# Altium schematic symbol library JL_SCH.SchLib: 1185 symbols (part 5 of 6) (continued)
## STC15F1K60XW-LQFP44 (continued)

## STC15F1K60XW-PDIP40
designator U?
footprint PDIP-40
pins: 1 P0.0/AD0, 2 P0.1/AD1, 3 P0.2/AD2, 4 P0.3/AD3, 5 P0.4/AD4, 6 P0.5/AD5, 7 P0.6/AD6, 8 P0.7/AD7, 9 P1.0, 10 P1.1, 11 P1.2/CMP+, 12 P1.3, 13 P1.4/CMP-, 14 P1.5, 15 P1.6/RxD_3/XTAL2, 16 P1.7/TxD_3/XTAL1, 17 P5.4/RST/MCLKO, 18 VCC (power), 19 P5.5/CAP, 20 GND (power), 21 T2CLKO/~{INT4}/RxD/P3.0, 22 T2/TxD/P3.1, 23 INT0/P3.2, 24 INT1/P3.3, 25 T1CLKO/T0/P3.4, 26 T0CLKO/T1/P3.5, 27 RxD_2/~{INT2}/P3.6, 28 TxD_2/~{INT3}/P3.7, 29 P4.1, 30 ~{WR}/P4.2, 31 ~{RD}/P4.4, 32 RSTOUT_LOW/A8/P2.0, 33 A9/P2.1, 34 A10/P2.2, 35 A11/P2.3, 36 A12/P2.4, 37 A13/P2.5, 38 A14/P2.6, 39 A15/P2.7, 40 ALE/P4.5

## STC15F1K60XW-PLCC44
designator U?
footprint PLCC-44
pins: 1 P4.6, 2 AD0/P0.0, 3 AD1/P0.1, 4 AD2/P0.2, 5 AD3/P0.3, 6 AD4/P0.4, 7 P0.5/AD5, 8 P0.6/AD6, 9 P0.7/AD7, 10 P1.0, 11 P1.1, 12 P4.7, 13 P1.2/CMP+, 14 P1.3, 15 P1.4/CMP-, 16 P1.5, 17 P1.6/RxD_3/XTAL2, 18 P1.7/TxD_3/XTAL1, 19 P5.4/RST/MCLKO, 20 VCC (power), 21 P5.5/CAP, 22 GND (power), 23 P4.0, 24 P3.0/RxD/~{INT4}/T2CLKO, 25 P3.1/TxD/T2, 26 P3.2/INT0, 27 P3.3/INT1, 28 P3.4/T0/T1CLKO, 29 T0CLKO/T1/P3.5, 30 RxD_2/~{INT2}/P3.6, 31 TxD_2/~{INT3}/P3.7, 32 P4.1, 33 ~{WR}/P4.2, 34 P4.3, 35 ~{RD}/P4.4, 36 RSTOUT_LOW/A8/P2.0, 37 A9/P2.1, 38 A10/P2.2, 39 A11/P2.3, 40 A12/P2.4, 41 A13/P2.5, 42 A14/P2.6, 43 A15/P2.7, 44 ALE/P4.5

## STC15F1K60XW-SOP28/SKDIP28
designator U?
footprint SOP-28
footprint SKDIP-28
pins: 1 P2.6, 2 P2.7, 3 P1.0, 4 P1.1, 5 P1.2/CMP+, 6 P1.3, 7 P1.4/CMP-, 8 P1.5, 9 P1.6/RxD_3/XTAL2, 10 P1.7/TxD_3/XTAL1, 11 P5.4/RST/MCLKO, 12 VCC (power), 13 P5.5/CAP, 14 GND (power), 15 T2CLKO/~{INT4}/RxD/P3.0, 16 T2/TxD/P3.1, 17 INT0/P3.2, 18 INT1/P3.3, 19 T1CLKO/T0/P3.4, 20 T0CLKO/T1/P3.5, 21 RxD_2/~{INT2}/P3.6, 22 TxD_2/~{INT3}/P3.7, 23 RSTOUT_LOW/P2.0, 24 P2.1, 25 P2.2, 26 P2.3, 27 P2.4, 28 P2.5

## STC15F1K60XW-SOP32
designator U?
footprint SOP-32
pins: 1 P0.0, 2 P0.1, 3 P0.2, 4 P0.3, 5 P1.0, 6 P1.1, 7 P1.2/CMP+, 8 P1.3, 9 P1.4/CMP-, 10 P1.5, 11 P1.6/RxD_3/XTAL2, 12 P1.7/TxD_3/XTAL1, 13 P5.4/RST/MCLKO, 14 VCC (power), 15 P5.5/CAP, 16 GND (power), 17 T2CLKO/~{INT4}/RxD/P3.0, 18 T2/TxD/P3.1, 19 INT0/P3.2, 20 INT1/P3.3, 21 T1CLKO/T0/P3.4, 22 T0CLKO/T1/P3.5, 23 RxD_2/~{INT2}/P3.6, 24 TxD_2/~{INT3}/P3.7, 25 RSTOUT_LOW/P2.0, 26 P2.1, 27 P2.2, 28 P2.3, 29 P2.4, 30 P2.5, 31 P2.6, 32 P2.7

## STC15F2K60S2-LQFP32
designator U?
footprint LQFP-32
pins: 1 P1.0/ADC0/CCP1/RxD2, 2 P1.1/ADC1/CCP0/TxD2, 3 P1.2/ADC2/SS/ECI, 4 P1.3/ADC3/MOSI, 5 P1.4/ADC4/MISO, 6 P1.5/ADC5/SCLK, 7 P1.6/ADC6/RxD_3/XTAL2, 8 P1.7/ADC7/TxD_3/XTAL1, 9 MCLKO/RST/P5.4, 10 VCC (power), 11 P5.5, 12 GND (power), 13 T2CLKO/~{INT4}/RxD/P3.0, 14 T2/TxD/P3.1, 15 INT0/P3.2, 16 INT1/P3.3, 17 ECI_2/T1CLKO/T0/P3.4, 18 CCP0_2/T0CLKO/T1/P3.5, 19 CCP1_2/RxD_2/~{INT2}/P3.6, 20 CCP2_2/CCP2/TxD_2/~{INT3}/P3.7, 21 RSTOUT_LOW/P2.0, 22 SCLK_2/P2.1, 23 MISO_2/P2.2, 24 MOSI_2/P2.3, 25 P2.4/ECI_3/SS_2, 26 P2.5/CCP0_3, 27 P2.6/CCP1_3, 28 P2.7/CCP2_3, 29 P0.0, 30 P0.1, 31 P0.2, 32 P0.3

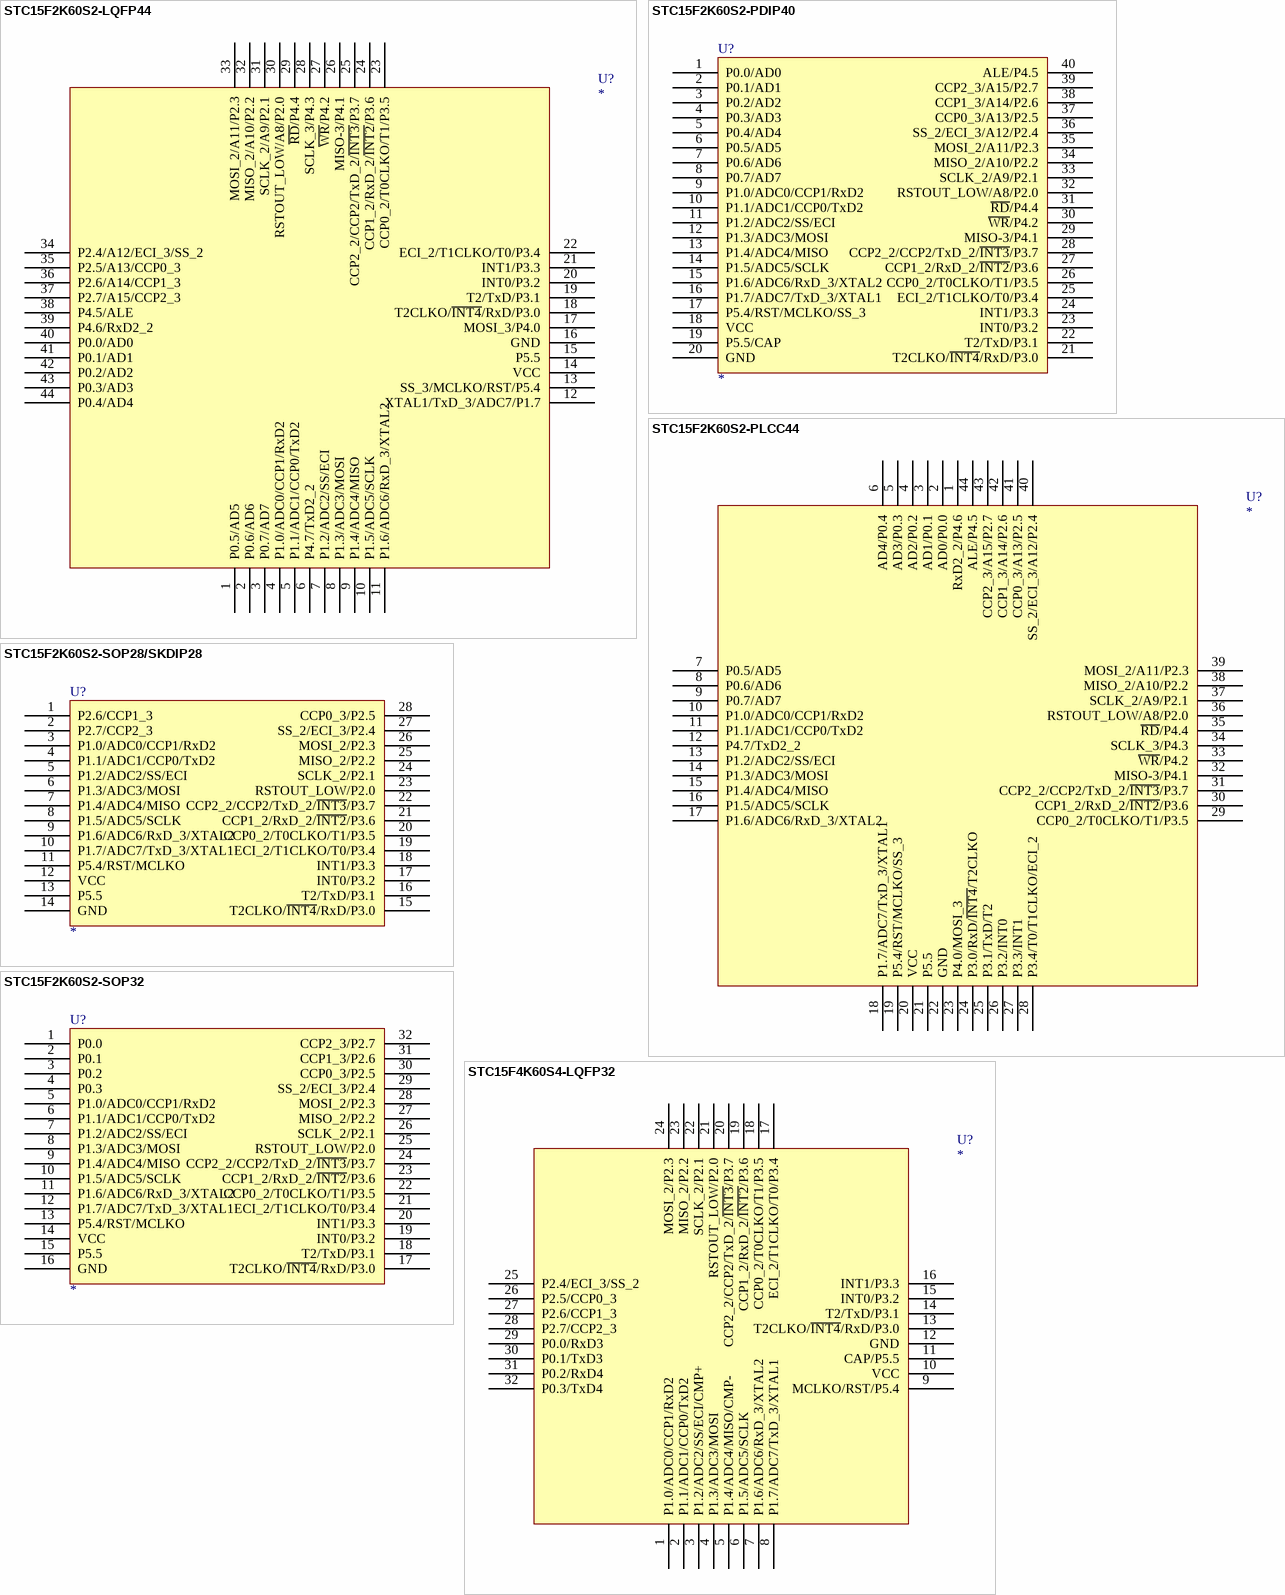
[diagram p31: symbols STC15F2K60S2-LQFP44 to STC15F4K60S4-LQFP32]

## STC15F2K60S2-LQFP44
designator U?
footprint LQFP-44
pins: 1 P0.5/AD5, 2 P0.6/AD6, 3 P0.7/AD7, 4 P1.0/ADC0/CCP1/RxD2, 5 P1.1/ADC1/CCP0/TxD2, 6 P4.7/TxD2_2, 7 P1.2/ADC2/SS/ECI, 8 P1.3/ADC3/MOSI, 9 P1.4/ADC4/MISO, 10 P1.5/ADC5/SCLK, 11 P1.6/ADC6/RxD_3/XTAL2, 12 XTAL1/TxD_3/ADC7/P1.7, 13 SS_3/MCLKO/RST/P5.4, 14 VCC (power), 15 P5.5, 16 GND (power), 17 MOSI_3/P4.0, 18 T2CLKO/~{INT4}/RxD/P3.0, 19 T2/TxD/P3.1, 20 INT0/P3.2, 21 INT1/P3.3, 22 ECI_2/T1CLKO/T0/P3.4, 23 CCP0_2/T0CLKO/T1/P3.5, 24 CCP1_2/RxD_2/~{INT2}/P3.6, 25 CCP2_2/CCP2/TxD_2/~{INT3}/P3.7, 26 MISO-3/P4.1, 27 ~{WR}/P4.2, 28 SCLK_3/P4.3, 29 ~{RD}/P4.4, 30 RSTOUT_LOW/A8/P2.0, 31 SCLK_2/A9/P2.1, 32 MISO_2/A10/P2.2, 33 MOSI_2/A11/P2.3, 34 P2.4/A12/ECI_3/SS_2, 35 P2.5/A13/CCP0_3, 36 P2.6/A14/CCP1_3, 37 P2.7/A15/CCP2_3, 38 P4.5/ALE, 39 P4.6/RxD2_2, 40 P0.0/AD0, 41 P0.1/AD1, 42 P0.2/AD2, 43 P0.3/AD3, 44 P0.4/AD4

## STC15F2K60S2-PDIP40
designator U?
footprint PDIP-40
pins: 1 P0.0/AD0, 2 P0.1/AD1, 3 P0.2/AD2, 4 P0.3/AD3, 5 P0.4/AD4, 6 P0.5/AD5, 7 P0.6/AD6, 8 P0.7/AD7, 9 P1.0/ADC0/CCP1/RxD2, 10 P1.1/ADC1/CCP0/TxD2, 11 P1.2/ADC2/SS/ECI, 12 P1.3/ADC3/MOSI, 13 P1.4/ADC4/MISO, 14 P1.5/ADC5/SCLK, 15 P1.6/ADC6/RxD_3/XTAL2, 16 P1.7/ADC7/TxD_3/XTAL1, 17 P5.4/RST/MCLKO/SS_3, 18 VCC (power), 19 P5.5/CAP, 20 GND (power), 21 T2CLKO/~{INT4}/RxD/P3.0, 22 T2/TxD/P3.1, 23 INT0/P3.2, 24 INT1/P3.3, 25 ECI_2/T1CLKO/T0/P3.4, 26 CCP0_2/T0CLKO/T1/P3.5, 27 CCP1_2/RxD_2/~{INT2}/P3.6, 28 CCP2_2/CCP2/TxD_2/~{INT3}/P3.7, 29 MISO-3/P4.1, 30 ~{WR}/P4.2, 31 ~{RD}/P4.4, 32 RSTOUT_LOW/A8/P2.0, 33 SCLK_2/A9/P2.1, 34 MISO_2/A10/P2.2, 35 MOSI_2/A11/P2.3, 36 SS_2/ECI_3/A12/P2.4, 37 CCP0_3/A13/P2.5, 38 CCP1_3/A14/P2.6, 39 CCP2_3/A15/P2.7, 40 ALE/P4.5

## STC15F2K60S2-PLCC44
designator U?
footprint PLCC-44
pins: 1 RxD2_2/P4.6, 2 AD0/P0.0, 3 AD1/P0.1, 4 AD2/P0.2, 5 AD3/P0.3, 6 AD4/P0.4, 7 P0.5/AD5, 8 P0.6/AD6, 9 P0.7/AD7, 10 P1.0/ADC0/CCP1/RxD2, 11 P1.1/ADC1/CCP0/TxD2, 12 P4.7/TxD2_2, 13 P1.2/ADC2/SS/ECI, 14 P1.3/ADC3/MOSI, 15 P1.4/ADC4/MISO, 16 P1.5/ADC5/SCLK, 17 P1.6/ADC6/RxD_3/XTAL2, 18 P1.7/ADC7/TxD_3/XTAL1, 19 P5.4/RST/MCLKO/SS_3, 20 VCC (power), 21 P5.5, 22 GND (power), 23 P4.0/MOSI_3, 24 P3.0/RxD/~{INT4}/T2CLKO, 25 P3.1/TxD/T2, 26 P3.2/INT0, 27 P3.3/INT1, 28 P3.4/T0/T1CLKO/ECI_2, 29 CCP0_2/T0CLKO/T1/P3.5, 30 CCP1_2/RxD_2/~{INT2}/P3.6, 31 CCP2_2/CCP2/TxD_2/~{INT3}/P3.7, 32 MISO-3/P4.1, 33 ~{WR}/P4.2, 34 SCLK_3/P4.3, 35 ~{RD}/P4.4, 36 RSTOUT_LOW/A8/P2.0, 37 SCLK_2/A9/P2.1, 38 MISO_2/A10/P2.2, 39 MOSI_2/A11/P2.3, 40 SS_2/ECI_3/A12/P2.4, 41 CCP0_3/A13/P2.5, 42 CCP1_3/A14/P2.6, 43 CCP2_3/A15/P2.7, 44 ALE/P4.5

## STC15F2K60S2-SOP28/SKDIP28
designator U?
footprint SOP-28
footprint SKDIP-28
pins: 1 P2.6/CCP1_3, 2 P2.7/CCP2_3, 3 P1.0/ADC0/CCP1/RxD2, 4 P1.1/ADC1/CCP0/TxD2, 5 P1.2/ADC2/SS/ECI, 6 P1.3/ADC3/MOSI, 7 P1.4/ADC4/MISO, 8 P1.5/ADC5/SCLK, 9 P1.6/ADC6/RxD_3/XTAL2, 10 P1.7/ADC7/TxD_3/XTAL1, 11 P5.4/RST/MCLKO, 12 VCC (power), 13 P5.5, 14 GND (power), 15 T2CLKO/~{INT4}/RxD/P3.0, 16 T2/TxD/P3.1, 17 INT0/P3.2, 18 INT1/P3.3, 19 ECI_2/T1CLKO/T0/P3.4, 20 CCP0_2/T0CLKO/T1/P3.5, 21 CCP1_2/RxD_2/~{INT2}/P3.6, 22 CCP2_2/CCP2/TxD_2/~{INT3}/P3.7, 23 RSTOUT_LOW/P2.0, 24 SCLK_2/P2.1, 25 MISO_2/P2.2, 26 MOSI_2/P2.3, 27 SS_2/ECI_3/P2.4, 28 CCP0_3/P2.5

## STC15F2K60S2-SOP32
designator U?
footprint SOP-32
pins: 1 P0.0, 2 P0.1, 3 P0.2, 4 P0.3, 5 P1.0/ADC0/CCP1/RxD2, 6 P1.1/ADC1/CCP0/TxD2, 7 P1.2/ADC2/SS/ECI, 8 P1.3/ADC3/MOSI, 9 P1.4/ADC4/MISO, 10 P1.5/ADC5/SCLK, 11 P1.6/ADC6/RxD_3/XTAL2, 12 P1.7/ADC7/TxD_3/XTAL1, 13 P5.4/RST/MCLKO, 14 VCC (power), 15 P5.5, 16 GND (power), 17 T2CLKO/~{INT4}/RxD/P3.0, 18 T2/TxD/P3.1, 19 INT0/P3.2, 20 INT1/P3.3, 21 ECI_2/T1CLKO/T0/P3.4, 22 CCP0_2/T0CLKO/T1/P3.5, 23 CCP1_2/RxD_2/~{INT2}/P3.6, 24 CCP2_2/CCP2/TxD_2/~{INT3}/P3.7, 25 RSTOUT_LOW/P2.0, 26 SCLK_2/P2.1, 27 MISO_2/P2.2, 28 MOSI_2/P2.3, 29 SS_2/ECI_3/P2.4, 30 CCP0_3/P2.5, 31 CCP1_3/P2.6, 32 CCP2_3/P2.7

## STC15F4K60S4-LQFP32
designator U?
footprint LQFP-32
pins: 1 P1.0/ADC0/CCP1/RxD2, 2 P1.1/ADC1/CCP0/TxD2, 3 P1.2/ADC2/SS/ECI/CMP+, 4 P1.3/ADC3/MOSI, 5 P1.4/ADC4/MISO/CMP-, 6 P1.5/ADC5/SCLK, 7 P1.6/ADC6/RxD_3/XTAL2, 8 P1.7/ADC7/TxD_3/XTAL1, 9 MCLKO/RST/P5.4, 10 VCC (power), 11 CAP/P5.5, 12 GND (power), 13 T2CLKO/~{INT4}/RxD/P3.0, 14 T2/TxD/P3.1, 15 INT0/P3.2, 16 INT1/P3.3, 17 ECI_2/T1CLKO/T0/P3.4, 18 CCP0_2/T0CLKO/T1/P3.5, 19 CCP1_2/RxD_2/~{INT2}/P3.6, 20 CCP2_2/CCP2/TxD_2/~{INT3}/P3.7, 21 RSTOUT_LOW/P2.0, 22 SCLK_2/P2.1, 23 MISO_2/P2.2, 24 MOSI_2/P2.3, 25 P2.4/ECI_3/SS_2, 26 P2.5/CCP0_3, 27 P2.6/CCP1_3, 28 P2.7/CCP2_3, 29 P0.0/RxD3, 30 P0.1/TxD3, 31 P0.2/RxD4, 32 P0.3/TxD4

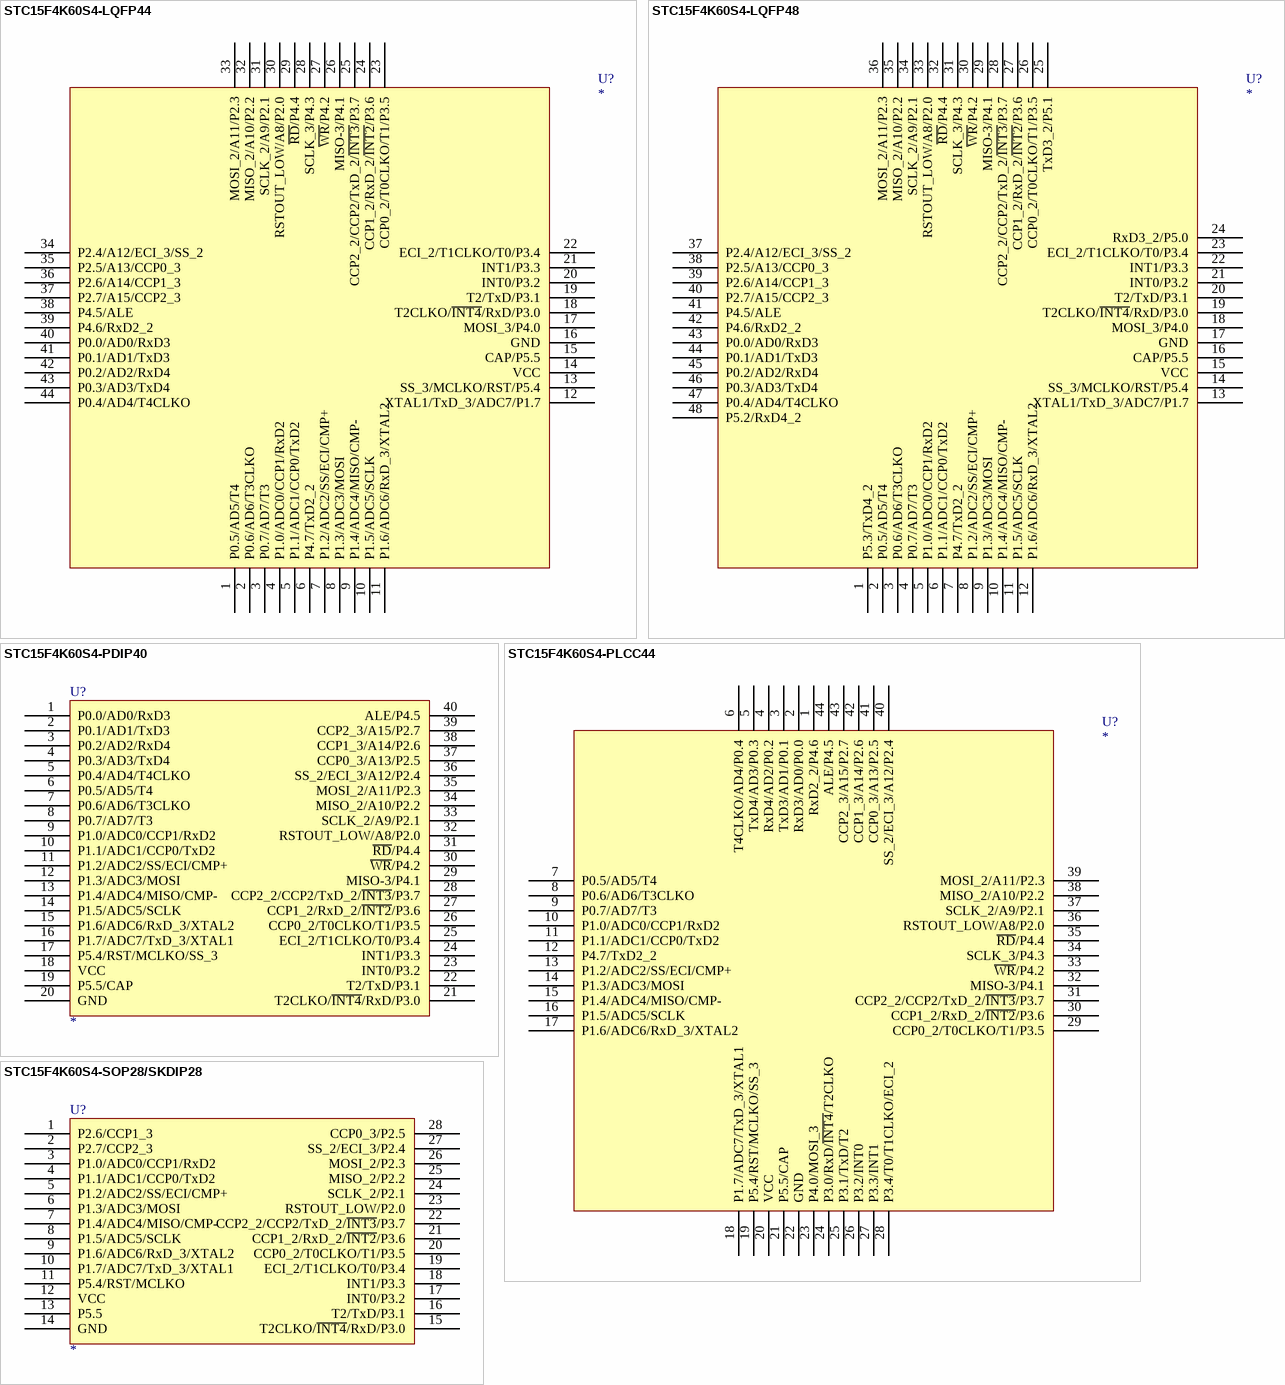
[diagram p32: symbols STC15F4K60S4-LQFP44 to STC15F4K60S4-SOP28/SKDIP28]

## STC15F4K60S4-LQFP44
designator U?
footprint LQFP-44
pins: 1 P0.5/AD5/T4, 2 P0.6/AD6/T3CLKO, 3 P0.7/AD7/T3, 4 P1.0/ADC0/CCP1/RxD2, 5 P1.1/ADC1/CCP0/TxD2, 6 P4.7/TxD2_2, 7 P1.2/ADC2/SS/ECI/CMP+, 8 P1.3/ADC3/MOSI, 9 P1.4/ADC4/MISO/CMP-, 10 P1.5/ADC5/SCLK, 11 P1.6/ADC6/RxD_3/XTAL2, 12 XTAL1/TxD_3/ADC7/P1.7, 13 SS_3/MCLKO/RST/P5.4, 14 VCC (power), 15 CAP/P5.5, 16 GND (power), 17 MOSI_3/P4.0, 18 T2CLKO/~{INT4}/RxD/P3.0, 19 T2/TxD/P3.1, 20 INT0/P3.2, 21 INT1/P3.3, 22 ECI_2/T1CLKO/T0/P3.4, 23 CCP0_2/T0CLKO/T1/P3.5, 24 CCP1_2/RxD_2/~{INT2}/P3.6, 25 CCP2_2/CCP2/TxD_2/~{INT3}/P3.7, 26 MISO-3/P4.1, 27 ~{WR}/P4.2, 28 SCLK_3/P4.3, 29 ~{RD}/P4.4, 30 RSTOUT_LOW/A8/P2.0, 31 SCLK_2/A9/P2.1, 32 MISO_2/A10/P2.2, 33 MOSI_2/A11/P2.3, 34 P2.4/A12/ECI_3/SS_2, 35 P2.5/A13/CCP0_3, 36 P2.6/A14/CCP1_3, 37 P2.7/A15/CCP2_3, 38 P4.5/ALE, 39 P4.6/RxD2_2, 40 P0.0/AD0/RxD3, 41 P0.1/AD1/TxD3, 42 P0.2/AD2/RxD4, 43 P0.3/AD3/TxD4, 44 P0.4/AD4/T4CLKO

## STC15F4K60S4-LQFP48
designator U?
footprint LQFP-48
pins: 1 P5.3/TxD4_2, 2 P0.5/AD5/T4, 3 P0.6/AD6/T3CLKO, 4 P0.7/AD7/T3, 5 P1.0/ADC0/CCP1/RxD2, 6 P1.1/ADC1/CCP0/TxD2, 7 P4.7/TxD2_2, 8 P1.2/ADC2/SS/ECI/CMP+, 9 P1.3/ADC3/MOSI, 10 P1.4/ADC4/MISO/CMP-, 11 P1.5/ADC5/SCLK, 12 P1.6/ADC6/RxD_3/XTAL2, 13 XTAL1/TxD_3/ADC7/P1.7, 14 SS_3/MCLKO/RST/P5.4, 15 VCC (power), 16 CAP/P5.5, 17 GND, 18 MOSI_3/P4.0, 19 T2CLKO/~{INT4}/RxD/P3.0, 20 T2/TxD/P3.1, 21 INT0/P3.2, 22 INT1/P3.3, 23 ECI_2/T1CLKO/T0/P3.4, 24 RxD3_2/P5.0, 25 TxD3_2/P5.1, 26 CCP0_2/T0CLKO/T1/P3.5, 27 CCP1_2/RxD_2/~{INT2}/P3.6, 28 CCP2_2/CCP2/TxD_2/~{INT3}/P3.7, 29 MISO-3/P4.1, 30 ~{WR}/P4.2, 31 SCLK_3/P4.3, 32 ~{RD}/P4.4, 33 RSTOUT_LOW/A8/P2.0, 34 SCLK_2/A9/P2.1, 35 MISO_2/A10/P2.2, 36 MOSI_2/A11/P2.3, 37 P2.4/A12/ECI_3/SS_2, 38 P2.5/A13/CCP0_3, 39 P2.6/A14/CCP1_3, 40 P2.7/A15/CCP2_3, 41 P4.5/ALE, 42 P4.6/RxD2_2, 43 P0.0/AD0/RxD3, 44 P0.1/AD1/TxD3, 45 P0.2/AD2/RxD4, 46 P0.3/AD3/TxD4, 47 P0.4/AD4/T4CLKO, 48 P5.2/RxD4_2

## STC15F4K60S4-PDIP40
designator U?
footprint PDIP-40
pins: 1 P0.0/AD0/RxD3, 2 P0.1/AD1/TxD3, 3 P0.2/AD2/RxD4, 4 P0.3/AD3/TxD4, 5 P0.4/AD4/T4CLKO, 6 P0.5/AD5/T4, 7 P0.6/AD6/T3CLKO, 8 P0.7/AD7/T3, 9 P1.0/ADC0/CCP1/RxD2, 10 P1.1/ADC1/CCP0/TxD2, 11 P1.2/ADC2/SS/ECI/CMP+, 12 P1.3/ADC3/MOSI, 13 P1.4/ADC4/MISO/CMP-, 14 P1.5/ADC5/SCLK, 15 P1.6/ADC6/RxD_3/XTAL2, 16 P1.7/ADC7/TxD_3/XTAL1, 17 P5.4/RST/MCLKO/SS_3, 18 VCC (power), 19 P5.5/CAP, 20 GND (power), 21 T2CLKO/~{INT4}/RxD/P3.0, 22 T2/TxD/P3.1, 23 INT0/P3.2, 24 INT1/P3.3, 25 ECI_2/T1CLKO/T0/P3.4, 26 CCP0_2/T0CLKO/T1/P3.5, 27 CCP1_2/RxD_2/~{INT2}/P3.6, 28 CCP2_2/CCP2/TxD_2/~{INT3}/P3.7, 29 MISO-3/P4.1, 30 ~{WR}/P4.2, 31 ~{RD}/P4.4, 32 RSTOUT_LOW/A8/P2.0, 33 SCLK_2/A9/P2.1, 34 MISO_2/A10/P2.2, 35 MOSI_2/A11/P2.3, 36 SS_2/ECI_3/A12/P2.4, 37 CCP0_3/A13/P2.5, 38 CCP1_3/A14/P2.6, 39 CCP2_3/A15/P2.7, 40 ALE/P4.5

## STC15F4K60S4-PLCC44
designator U?
footprint PLCC-44
pins: 1 RxD2_2/P4.6, 2 RxD3/AD0/P0.0, 3 TxD3/AD1/P0.1, 4 RxD4/AD2/P0.2, 5 TxD4/AD3/P0.3, 6 T4CLKO/AD4/P0.4, 7 P0.5/AD5/T4, 8 P0.6/AD6/T3CLKO, 9 P0.7/AD7/T3, 10 P1.0/ADC0/CCP1/RxD2, 11 P1.1/ADC1/CCP0/TxD2, 12 P4.7/TxD2_2, 13 P1.2/ADC2/SS/ECI/CMP+, 14 P1.3/ADC3/MOSI, 15 P1.4/ADC4/MISO/CMP-, 16 P1.5/ADC5/SCLK, 17 P1.6/ADC6/RxD_3/XTAL2, 18 P1.7/ADC7/TxD_3/XTAL1, 19 P5.4/RST/MCLKO/SS_3, 20 VCC (power), 21 P5.5/CAP, 22 GND (power), 23 P4.0/MOSI_3, 24 P3.0/RxD/~{INT4}/T2CLKO, 25 P3.1/TxD/T2, 26 P3.2/INT0, 27 P3.3/INT1, 28 P3.4/T0/T1CLKO/ECI_2, 29 CCP0_2/T0CLKO/T1/P3.5, 30 CCP1_2/RxD_2/~{INT2}/P3.6, 31 CCP2_2/CCP2/TxD_2/~{INT3}/P3.7, 32 MISO-3/P4.1, 33 ~{WR}/P4.2, 34 SCLK_3/P4.3, 35 ~{RD}/P4.4, 36 RSTOUT_LOW/A8/P2.0, 37 SCLK_2/A9/P2.1, 38 MISO_2/A10/P2.2, 39 MOSI_2/A11/P2.3, 40 SS_2/ECI_3/A12/P2.4, 41 CCP0_3/A13/P2.5, 42 CCP1_3/A14/P2.6, 43 CCP2_3/A15/P2.7, 44 ALE/P4.5

## STC15F4K60S4-SOP28/SKDIP28
designator U?
footprint SOP-28
footprint SKDIP-28
pins: 1 P2.6/CCP1_3, 2 P2.7/CCP2_3, 3 P1.0/ADC0/CCP1/RxD2, 4 P1.1/ADC1/CCP0/TxD2, 5 P1.2/ADC2/SS/ECI/CMP+, 6 P1.3/ADC3/MOSI, 7 P1.4/ADC4/MISO/CMP-, 8 P1.5/ADC5/SCLK, 9 P1.6/ADC6/RxD_3/XTAL2, 10 P1.7/ADC7/TxD_3/XTAL1, 11 P5.4/RST/MCLKO, 12 VCC (power), 13 P5.5, 14 GND (power), 15 T2CLKO/~{INT4}/RxD/P3.0, 16 T2/TxD/P3.1, 17 INT0/P3.2, 18 INT1/P3.3, 19 ECI_2/T1CLKO/T0/P3.4, 20 CCP0_2/T0CLKO/T1/P3.5, 21 CCP1_2/RxD_2/~{INT2}/P3.6, 22 CCP2_2/CCP2/TxD_2/~{INT3}/P3.7, 23 RSTOUT_LOW/P2.0, 24 SCLK_2/P2.1, 25 MISO_2/P2.2, 26 MOSI_2/P2.3, 27 SS_2/ECI_3/P2.4, 28 CCP0_3/P2.5

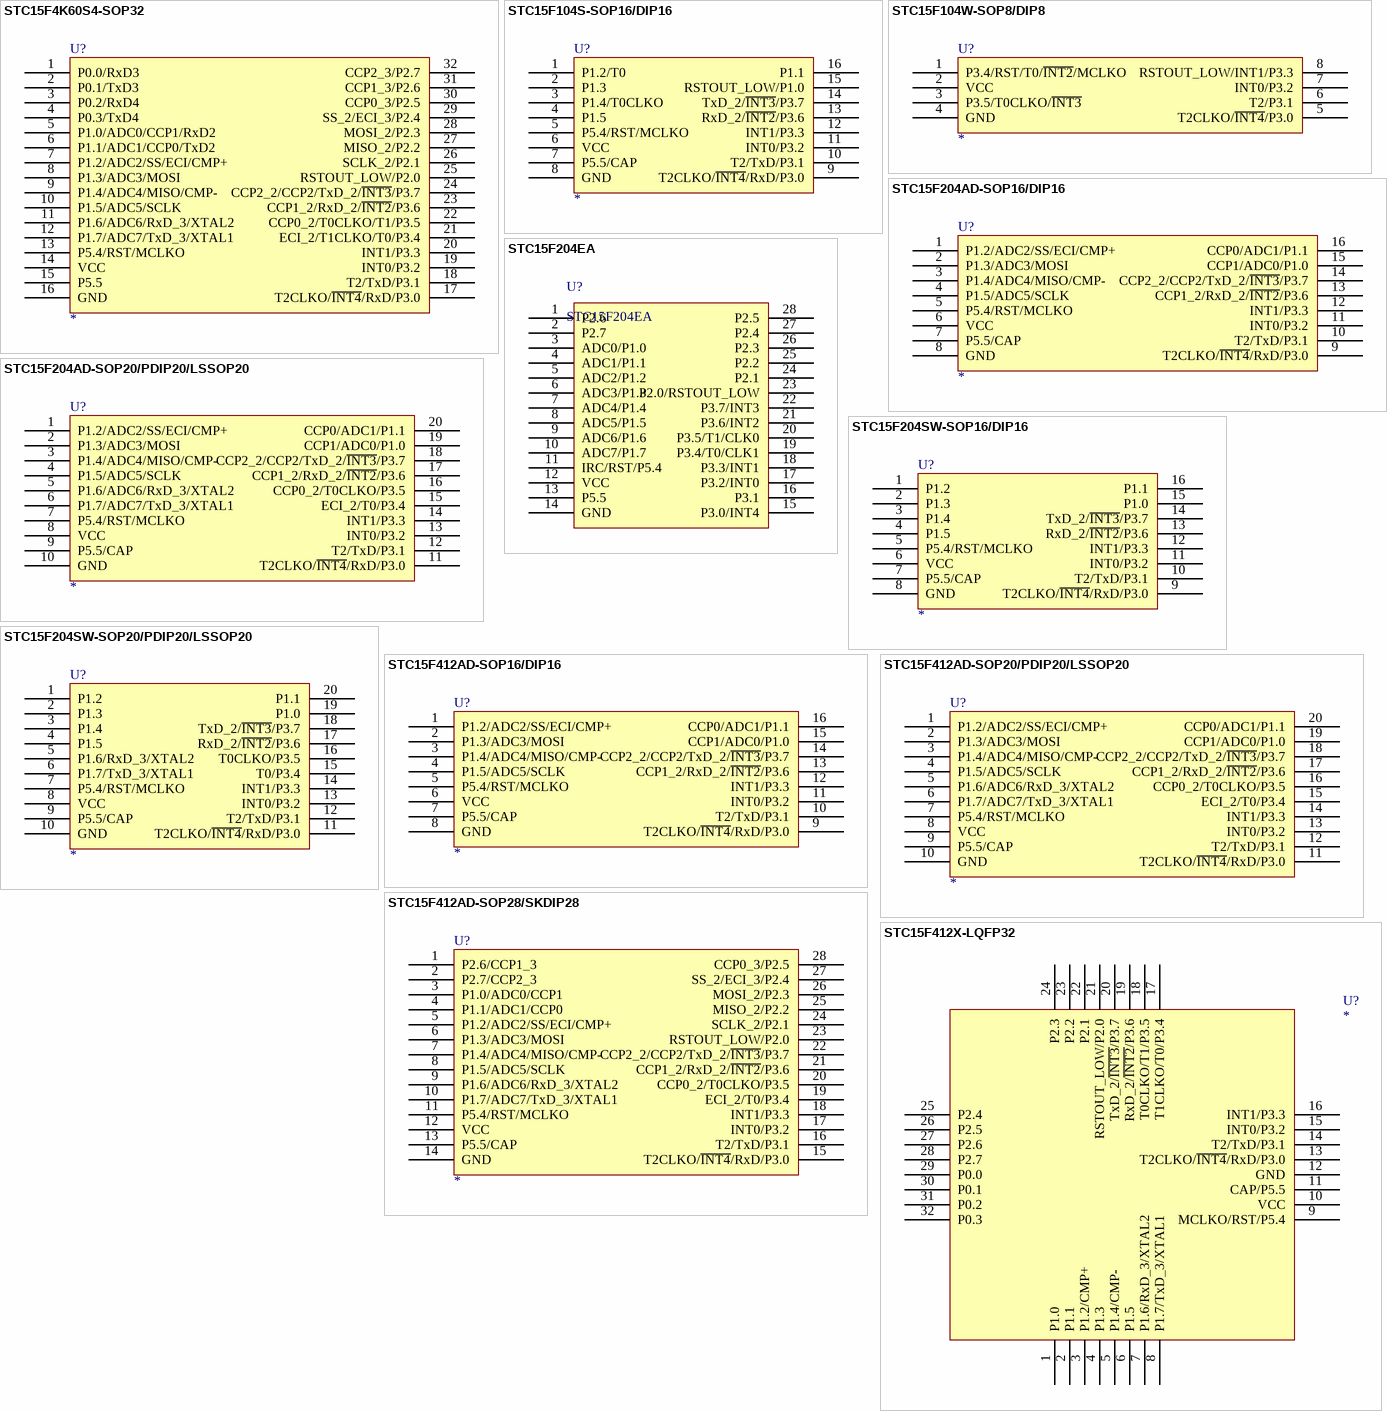
[diagram p33: symbols STC15F4K60S4-SOP32 to STC15F412X-LQFP32]

## STC15F4K60S4-SOP32
designator U?
footprint SOP-32
pins: 1 P0.0/RxD3, 2 P0.1/TxD3, 3 P0.2/RxD4, 4 P0.3/TxD4, 5 P1.0/ADC0/CCP1/RxD2, 6 P1.1/ADC1/CCP0/TxD2, 7 P1.2/ADC2/SS/ECI/CMP+, 8 P1.3/ADC3/MOSI, 9 P1.4/ADC4/MISO/CMP-, 10 P1.5/ADC5/SCLK, 11 P1.6/ADC6/RxD_3/XTAL2, 12 P1.7/ADC7/TxD_3/XTAL1, 13 P5.4/RST/MCLKO, 14 VCC (power), 15 P5.5, 16 GND (power), 17 T2CLKO/~{INT4}/RxD/P3.0, 18 T2/TxD/P3.1, 19 INT0/P3.2, 20 INT1/P3.3, 21 ECI_2/T1CLKO/T0/P3.4, 22 CCP0_2/T0CLKO/T1/P3.5, 23 CCP1_2/RxD_2/~{INT2}/P3.6, 24 CCP2_2/CCP2/TxD_2/~{INT3}/P3.7, 25 RSTOUT_LOW/P2.0, 26 SCLK_2/P2.1, 27 MISO_2/P2.2, 28 MOSI_2/P2.3, 29 SS_2/ECI_3/P2.4, 30 CCP0_3/P2.5, 31 CCP1_3/P2.6, 32 CCP2_3/P2.7

## STC15F104S-SOP16/DIP16
designator U?
footprint SOP-16
footprint DIP-16
pins: 1 P1.2/T0, 2 P1.3, 3 P1.4/T0CLKO, 4 P1.5, 5 P5.4/RST/MCLKO, 6 VCC (power), 7 P5.5/CAP, 8 GND (power), 9 T2CLKO/~{INT4}/RxD/P3.0, 10 T2/TxD/P3.1, 11 INT0/P3.2, 12 INT1/P3.3, 13 RxD_2/~{INT2}/P3.6, 14 TxD_2/~{INT3}/P3.7, 15 RSTOUT_LOW/P1.0, 16 P1.1

## STC15F104W-SOP8/DIP8
designator U?
footprint SOP-8
footprint DIP-8
pins: 1 P3.4/RST/T0/~{INT2}/MCLKO, 2 VCC (power), 3 P3.5/T0CLKO/~{INT3}, 4 GND (power), 5 T2CLKO/~{INT4}/P3.0, 6 T2/P3.1, 7 INT0/P3.2, 8 RSTOUT_LOW/INT1/P3.3

## STC15F204AD-SOP16/DIP16
designator U?
footprint SOP-16
footprint DIP-16
pins: 1 P1.2/ADC2/SS/ECI/CMP+, 2 P1.3/ADC3/MOSI, 3 P1.4/ADC4/MISO/CMP-, 4 P1.5/ADC5/SCLK, 5 P5.4/RST/MCLKO, 6 VCC (power), 7 P5.5/CAP, 8 GND (power), 9 T2CLKO/~{INT4}/RxD/P3.0, 10 T2/TxD/P3.1, 11 INT0/P3.2, 12 INT1/P3.3, 13 CCP1_2/RxD_2/~{INT2}/P3.6, 14 CCP2_2/CCP2/TxD_2/~{INT3}/P3.7, 15 CCP1/ADC0/P1.0, 16 CCP0/ADC1/P1.1

## STC15F204AD-SOP20/PDIP20/LSSOP20
designator U?
footprint SOP-20
footprint PDIP-20
footprint LSSOP-20
pins: 1 P1.2/ADC2/SS/ECI/CMP+, 2 P1.3/ADC3/MOSI, 3 P1.4/ADC4/MISO/CMP-, 4 P1.5/ADC5/SCLK, 5 P1.6/ADC6/RxD_3/XTAL2, 6 P1.7/ADC7/TxD_3/XTAL1, 7 P5.4/RST/MCLKO, 8 VCC (power), 9 P5.5/CAP, 10 GND (power), 11 T2CLKO/~{INT4}/RxD/P3.0, 12 T2/TxD/P3.1, 13 INT0/P3.2, 14 INT1/P3.3, 15 ECI_2/T0/P3.4, 16 CCP0_2/T0CLKO/P3.5, 17 CCP1_2/RxD_2/~{INT2}/P3.6, 18 CCP2_2/CCP2/TxD_2/~{INT3}/P3.7, 19 CCP1/ADC0/P1.0, 20 CCP0/ADC1/P1.1

## STC15F204EA
designator U?
footprint SOP-28
pins: 1 P2.6, 2 P2.7, 3 ADC0/P1.0, 4 ADC1/P1.1, 5 ADC2/P1.2, 6 ADC3/P1.3, 7 ADC4/P1.4, 8 ADC5/P1.5, 9 ADC6/P1.6, 10 ADC7/P1.7, 11 IRC/RST/P5.4, 12 VCC, 13 P5.5, 14 GND, 15 P3.0/INT4, 16 P3.1, 17 P3.2/INT0, 18 P3.3/INT1, 19 P3.4/T0/CLK1, 20 P3.5/T1/CLK0, 21 P3.6/INT2, 22 P3.7/INT3, 23 P2.0/RSTOUT_LOW, 24 P2.1, 25 P2.2, 26 P2.3, 27 P2.4, 28 P2.5

## STC15F204SW-SOP16/DIP16
designator U?
footprint SOP-16
footprint DIP-16
pins: 1 P1.2, 2 P1.3, 3 P1.4, 4 P1.5, 5 P5.4/RST/MCLKO, 6 VCC (power), 7 P5.5/CAP, 8 GND (power), 9 T2CLKO/~{INT4}/RxD/P3.0, 10 T2/TxD/P3.1, 11 INT0/P3.2, 12 INT1/P3.3, 13 RxD_2/~{INT2}/P3.6, 14 TxD_2/~{INT3}/P3.7, 15 P1.0, 16 P1.1

## STC15F204SW-SOP20/PDIP20/LSSOP20
designator U?
footprint SOP-20
footprint PDIP-20
footprint LSSOP-20
pins: 1 P1.2, 2 P1.3, 3 P1.4, 4 P1.5, 5 P1.6/RxD_3/XTAL2, 6 P1.7/TxD_3/XTAL1, 7 P5.4/RST/MCLKO, 8 VCC (power), 9 P5.5/CAP, 10 GND (power), 11 T2CLKO/~{INT4}/RxD/P3.0, 12 T2/TxD/P3.1, 13 INT0/P3.2, 14 INT1/P3.3, 15 T0/P3.4, 16 T0CLKO/P3.5, 17 RxD_2/~{INT2}/P3.6, 18 TxD_2/~{INT3}/P3.7, 19 P1.0, 20 P1.1

## STC15F412AD-SOP16/DIP16
designator U?
footprint SOP-16
footprint DIP-16
pins: 1 P1.2/ADC2/SS/ECI/CMP+, 2 P1.3/ADC3/MOSI, 3 P1.4/ADC4/MISO/CMP-, 4 P1.5/ADC5/SCLK, 5 P5.4/RST/MCLKO, 6 VCC (power), 7 P5.5/CAP, 8 GND (power), 9 T2CLKO/~{INT4}/RxD/P3.0, 10 T2/TxD/P3.1, 11 INT0/P3.2, 12 INT1/P3.3, 13 CCP1_2/RxD_2/~{INT2}/P3.6, 14 CCP2_2/CCP2/TxD_2/~{INT3}/P3.7, 15 CCP1/ADC0/P1.0, 16 CCP0/ADC1/P1.1

## STC15F412AD-SOP20/PDIP20/LSSOP20
designator U?
footprint SOP-20
footprint PDIP-20
footprint LSSOP-20
pins: 1 P1.2/ADC2/SS/ECI/CMP+, 2 P1.3/ADC3/MOSI, 3 P1.4/ADC4/MISO/CMP-, 4 P1.5/ADC5/SCLK, 5 P1.6/ADC6/RxD_3/XTAL2, 6 P1.7/ADC7/TxD_3/XTAL1, 7 P5.4/RST/MCLKO, 8 VCC (power), 9 P5.5/CAP, 10 GND (power), 11 T2CLKO/~{INT4}/RxD/P3.0, 12 T2/TxD/P3.1, 13 INT0/P3.2, 14 INT1/P3.3, 15 ECI_2/T0/P3.4, 16 CCP0_2/T0CLKO/P3.5, 17 CCP1_2/RxD_2/~{INT2}/P3.6, 18 CCP2_2/CCP2/TxD_2/~{INT3}/P3.7, 19 CCP1/ADC0/P1.0, 20 CCP0/ADC1/P1.1

## STC15F412AD-SOP28/SKDIP28
designator U?
footprint SOP-28
footprint SKDIP-28
pins: 1 P2.6/CCP1_3, 2 P2.7/CCP2_3, 3 P1.0/ADC0/CCP1, 4 P1.1/ADC1/CCP0, 5 P1.2/ADC2/SS/ECI/CMP+, 6 P1.3/ADC3/MOSI, 7 P1.4/ADC4/MISO/CMP-, 8 P1.5/ADC5/SCLK, 9 P1.6/ADC6/RxD_3/XTAL2, 10 P1.7/ADC7/TxD_3/XTAL1, 11 P5.4/RST/MCLKO, 12 VCC (power), 13 P5.5/CAP, 14 GND (power), 15 T2CLKO/~{INT4}/RxD/P3.0, 16 T2/TxD/P3.1, 17 INT0/P3.2, 18 INT1/P3.3, 19 ECI_2/T0/P3.4, 20 CCP0_2/T0CLKO/P3.5, 21 CCP1_2/RxD_2/~{INT2}/P3.6, 22 CCP2_2/CCP2/TxD_2/~{INT3}/P3.7, 23 RSTOUT_LOW/P2.0, 24 SCLK_2/P2.1, 25 MISO_2/P2.2, 26 MOSI_2/P2.3, 27 SS_2/ECI_3/P2.4, 28 CCP0_3/P2.5

## STC15F412X-LQFP32
designator U?
footprint LQFP-32
pins: 1 P1.0, 2 P1.1, 3 P1.2/CMP+, 4 P1.3, 5 P1.4/CMP-, 6 P1.5, 7 P1.6/RxD_3/XTAL2, 8 P1.7/TxD_3/XTAL1, 9 MCLKO/RST/P5.4, 10 VCC (power), 11 CAP/P5.5, 12 GND (power), 13 T2CLKO/~{INT4}/RxD/P3.0, 14 T2/TxD/P3.1, 15 INT0/P3.2, 16 INT1/P3.3, 17 T1CLKO/T0/P3.4, 18 T0CLKO/T1/P3.5, 19 RxD_2/~{INT2}/P3.6, 20 TxD_2/~{INT3}/P3.7, 21 RSTOUT_LOW/P2.0, 22 P2.1, 23 P2.2, 24 P2.3, 25 P2.4, 26 P2.5, 27 P2.6, 28 P2.7, 29 P0.0, 30 P0.1, 31 P0.2, 32 P0.3
